# Altium footprint library Reflow3D1411sep.PcbLib: 657 footprints (part 28 of 42)
Each footprint in its own frame and in the unit in brackets; x right, y up, seen from the top. Pads: shape width x height; smd on the part's side, far side on the other; paste and mask are expansions set on the pad; w line width, h text height; cw(c..) or ccw(c..) is an arc to the next point about the centre after c.
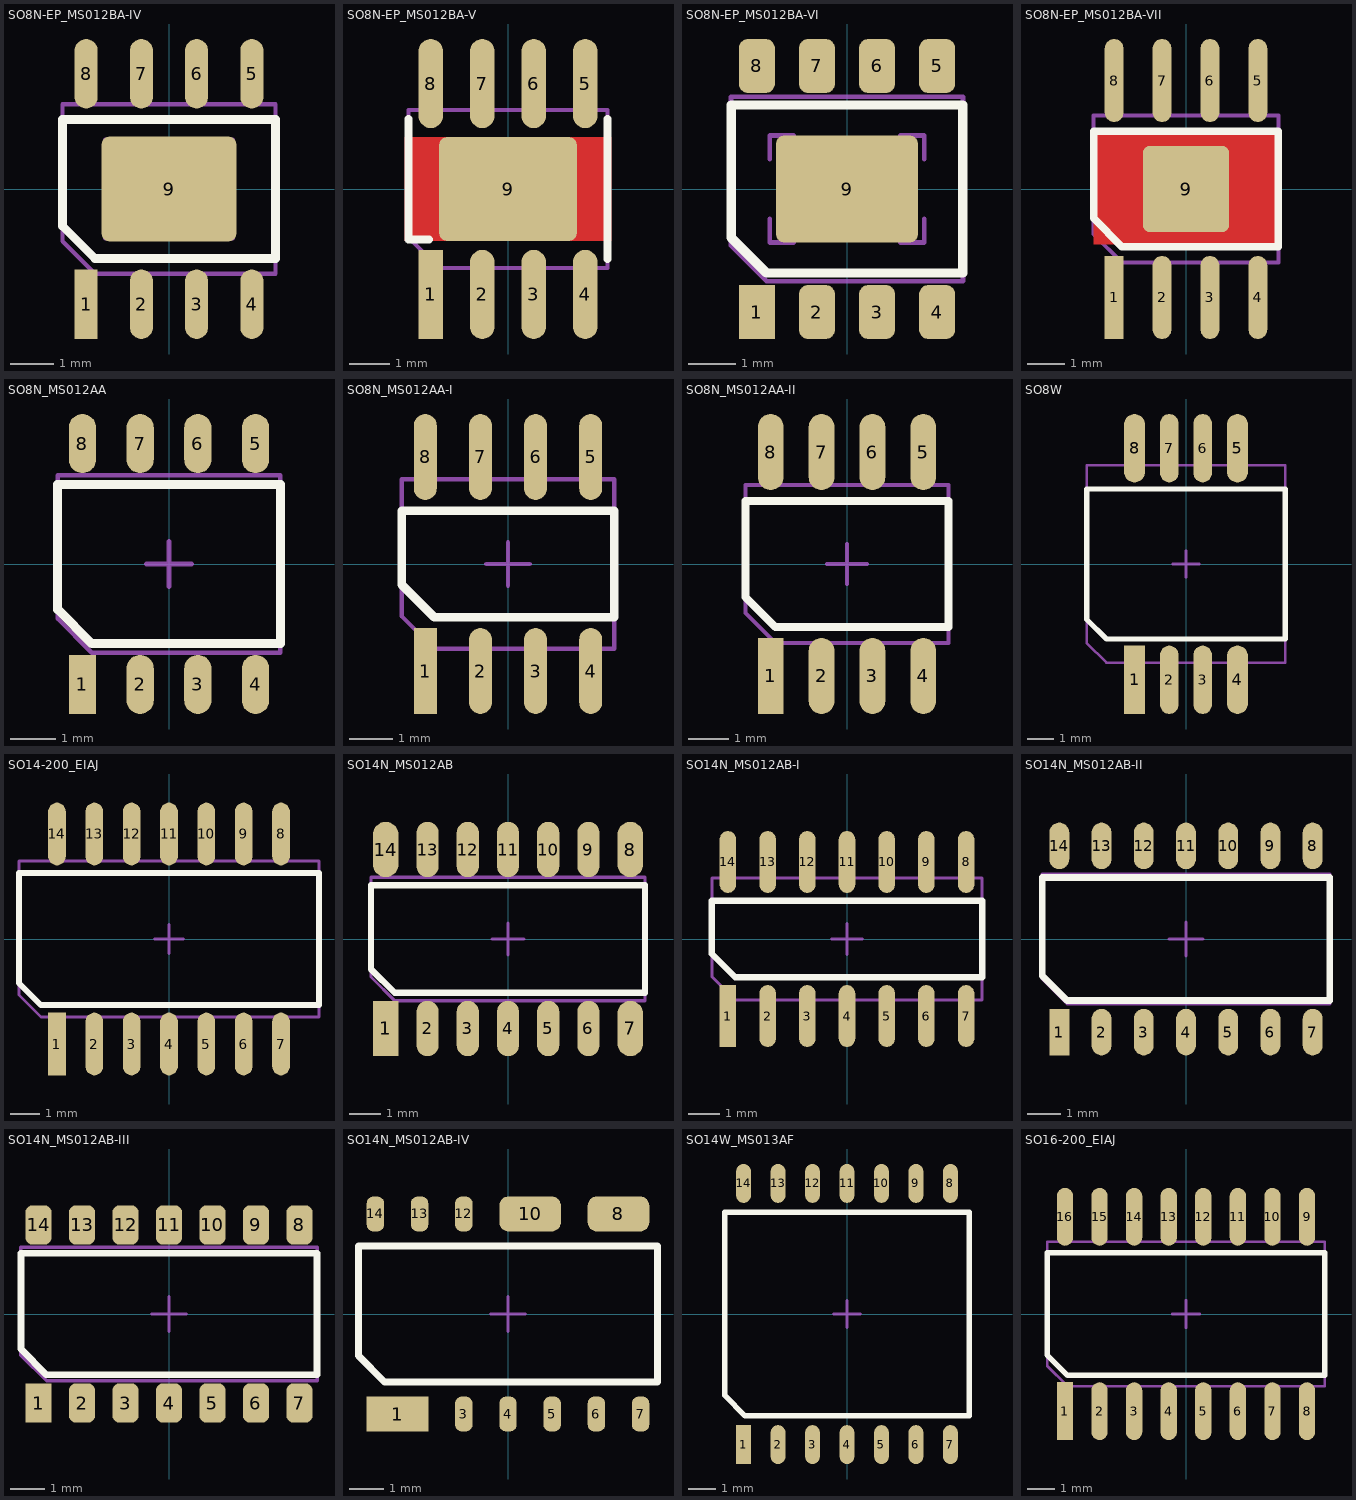
[diagram p27: the footprints below, top view; thin cyan lines are the x and y axes]

## SO8N-EP_MS012BA-IV [mm] "www.maxim-ic.com, 21-0111.PDF, 90-0150.PDF"
height 1.55
pads (9):
  rect 0.53x1.6 smd mask+0.075: 1(-1.905,-2.65)
  oval 0.53x1.6 smd mask+0.075: 2(-0.635,-2.65) 3(0.635,-2.65) 4(1.905,-2.65) 5(1.905,2.65) 6(0.635,2.65) 7(-0.635,2.65) 8(-1.905,2.65)
  rrect15% 3.1x2.41 smd mask+0.075: 9(0,0)
Top Overlay:
  lines w0.2: -2.45,-0.85 -1.7,-1.6 2.45,-1.6 2.45,1.6 -2.45,1.6 -2.45,-0.85
Mechanical 13:
  lines w0.1: -1.47,-0.63 -1.47,-1.13 -0.97,-1.13 ; -1.47,0.63 -1.47,1.13 -0.97,1.13 ; 0.97,-1.13 1.47,-1.13 1.47,-0.63 ; 0.97,1.13 1.47,1.13 1.47,0.63 ; -2.45,-1.2 -2.45,1.95 2.45,1.95 2.45,-1.95 -1.7,-1.95 -2.45,-1.2
Mechanical 15:
  lines w0.1: -0.5,0 0.5,0 ; 0,-0.5 0,0.5
3D body: height 1.68, standoff 0, extent -2.49,-1.995 2.49,1.995

## SO8N-EP_MS012BA-V [mm] "www.semtech.com, sc4520.pdf"
height 1.55
pads (9):
  rect 0.6x2.2 smd mask+0.05: 1(-1.905,-2.6)
  oval 0.6x2.2 smd mask+0.05: 2(-0.635,-2.6) 3(0.635,-2.6) 4(1.905,-2.6) 5(1.905,2.6) 6(0.635,2.6) 7(-0.635,2.6) 8(-1.905,2.6)
  rrect15% 3.4x2.56 smd paste+0 mask-25.4: 9(0,0)
Top Layer:
  region: -2.55,1.28 2.55,1.28 2.55,-1.28 -2.55,-1.28
Top Overlay:
  lines w0.2: -2.45,1.725 -2.45,-1.25 -1.95,-1.25 ; 2.45,-1.725 2.45,1.725
Top Solder:
  region: -1.7,1.33 -1.7,-1.33 1.7,-1.33 1.7,1.33
Mechanical 13:
  lines w0.1: -1.525,-0.705 -1.525,-1.205 -1.025,-1.205 ; -1.525,0.705 -1.525,1.205 -1.025,1.205 ; 1.025,-1.205 1.525,-1.205 1.525,-0.705 ; 1.025,1.205 1.525,1.205 1.525,0.705 ; -2.45,-1.2 -1.7,-1.95 2.45,-1.95 2.45,1.95 -2.45,1.95 -2.45,-1.2
Mechanical 15:
  lines w0.1: -0.5,0 0.5,0 ; 0,-0.5 0,0.5
3D body: height 1.75, standoff 0, extent -2.5,-2 2.5,2

## SO8N-EP_MS012BA-VI [mm] "www.linear.com, SO_8_05-08-1857.pdf"
height 1.55
pads (9):
  rect 0.76x1.14 smd mask+0.075: 1(-1.905,-2.6)
  rrect50% 0.76x1.14 smd mask+0.075: 2(-0.635,-2.6) 3(0.635,-2.6) 4(1.905,-2.6) 5(1.905,2.6) 6(0.635,2.6) 7(-0.635,2.6) 8(-1.905,2.6)
  rrect15% 3x2.26 smd mask+0.075: 9(0,0)
Top Overlay:
  lines w0.2: -2.45,-1.025 -2.45,1.775 2.45,1.775 2.45,-1.775 -1.7,-1.775 -2.45,-1.025
Mechanical 13:
  lines w0.1: -1.63,-0.63 -1.63,-1.13 -1.13,-1.13 ; -1.63,0.63 -1.63,1.13 -1.13,1.13 ; 1.13,-1.13 1.63,-1.13 1.63,-0.63 ; 1.13,1.13 1.63,1.13 1.63,0.63 ; -2.45,-1.2 -2.45,1.95 2.45,1.95 2.45,-1.95 -1.7,-1.95 -2.45,-1.2
Mechanical 15:
  lines w0.1: -0.5,0 0.5,0 ; 0,-0.5 0,0.5
3D body: height 1.75, standoff 0, extent -2.5,-1.995 2.5,1.995

## SO8N-EP_MS012BA-VII [mm] "www.ti.com, ths3095.pdf"
height 1.53
pads (9):
  rect 0.5x2.2 smd mask+0.075: 1(-1.905,-2.875)
  oval 0.5x2.2 smd mask+0.075: 2(-0.635,-2.875) 3(0.635,-2.875) 4(1.905,-2.875) 5(1.905,2.875) 6(0.635,2.875) 7(-0.635,2.875) 8(-1.905,2.875)
  rrect15% 2.28x2.28 smd mask+0: 9(0,0)
Top Layer:
  region: -2.445,1.47 2.445,1.47 2.445,-1.47 -2.445,-1.47
Top Overlay:
  lines w0.2: -2.45,-0.775 -1.7,-1.525 2.45,-1.525 2.45,1.525 -2.45,1.525 -2.45,-0.775
Mechanical 13:
  lines w0.1: -0.89,-0.39 -0.89,-0.89 -0.39,-0.89 ; -0.89,0.39 -0.89,0.89 -0.39,0.89 ; 0.39,-0.89 0.89,-0.89 0.89,-0.39 ; 0.39,0.89 0.89,0.89 0.89,0.39 ; -2.45,-1.2 -2.45,1.95 2.45,1.95 2.45,-1.95 -1.7,-1.95 -2.45,-1.2
Mechanical 15:
  lines w0.1: -0.5,0 0.5,0 ; 0,-0.5 0,0.5
3D body: height 1.7, standoff 0, extent -2.5,-2 2.5,2

## SO8N_MS012AA [mm] "www.nxp.com, sot096-1_po.pdf, SOT96-1_fr.pdf"
height 1.55
pads (8):
  rect 0.6x1.3 smd mask+0.075: 1(-1.905,-2.65)
  oval 0.6x1.3 smd mask+0.075: 2(-0.635,-2.65) 3(0.635,-2.65) 4(1.905,-2.65) 5(1.905,2.65) 6(0.635,2.65) 7(-0.635,2.65) 8(-1.905,2.65)
Top Overlay:
  lines w0.2: -2.45,-1 -2.45,1.75 2.45,1.75 2.45,-1.75 -1.7,-1.75 -2.45,-1
Mechanical 13:
  lines w0.1: -2.45,-1.2 -2.45,1.95 2.45,1.95 2.45,-1.95 -1.7,-1.95 -2.45,-1.2
Mechanical 15:
  lines w0.1: -0.5,0 0.5,0 ; 0,-0.5 0,0.5
3D body: height 1.75, standoff 0, extent -2.5,-2 2.5,2

## SO8N_MS012AA-I [mm] "www.maxim-ic.com, 21-0041.PDF, 90-0096.PDF; www.jedec.org, MS-012F.pdf"
height 1.55
pads (8):
  rect 0.53x1.98 smd mask+0.075: 1(-1.905,-2.465)
  oval 0.53x1.98 smd mask+0.075: 2(-0.635,-2.465) 3(0.635,-2.465) 4(1.905,-2.465) 5(1.905,2.465) 6(0.635,2.465) 7(-0.635,2.465) 8(-1.905,2.465)
Top Overlay:
  lines w0.2: -2.45,-0.475 -1.7,-1.225 2.45,-1.225 2.45,1.225 -2.45,1.225 -2.45,-0.475
Mechanical 13:
  lines w0.1: -2.45,-1.2 -1.7,-1.95 2.45,-1.95 2.45,1.95 -2.45,1.95 -2.45,-1.2
Mechanical 15:
  lines w0.1: -0.5,0 0.5,0 ; 0,-0.5 0,0.5
3D body: height 1.75, standoff 0, extent -2.5,-2 2.5,2

## SO8N_MS012AA-II [mm] "www.avagotech.com, AV01-0547EN.pdf"
height 3.38
pads (8):
  rect 0.64x1.9 smd mask+0.075: 1(-1.905,-2.795)
  oval 0.64x1.9 smd mask+0.075: 2(-0.635,-2.795) 3(0.635,-2.795) 4(1.905,-2.795) 5(1.905,2.795) 6(0.635,2.795) 7(-0.635,2.795) 8(-1.905,2.795)
Top Overlay:
  lines w0.2: -2.54,-0.825 -1.79,-1.575 2.54,-1.575 2.54,1.575 -2.54,1.575 -2.54,-0.825
Mechanical 13:
  lines w0.1: -2.54,-1.22 -1.79,-1.97 2.54,-1.97 2.54,1.97 -2.54,1.97 -2.54,-1.22
Mechanical 15:
  lines w0.1: -0.5,0 0.5,0 ; 0,-0.5 0,0.5
3D body: height 3.61, standoff 0, extent -2.6,-2.03 2.6,2.03

## SO8W [mm] "www.nxp.com, sot176-1.pdf, SOT176-1_fp_reflow.pdf"
height 2.5
pads (8):
  rect 0.8x2.6 smd mask+0.075: 1(-1.955,-4.4)
  oval 0.7x2.6 smd mask+0.075: 2(-0.635,-4.4) 3(0.635,-4.4) 6(0.635,4.4) 7(-0.635,4.4)
  oval 0.8x2.6 smd mask+0.075: 4(1.955,-4.4) 5(1.955,4.4) 8(-1.955,4.4)
Top Overlay:
  lines w0.2: -3.775,-2.1 -3.025,-2.85 3.775,-2.85 3.775,2.85 -3.775,2.85 -3.775,-2.1
Mechanical 13:
  lines w0.1: -3.775,-3 -3.775,3.75 3.775,3.75 3.775,-3.75 -3.025,-3.75 -3.775,-3
Mechanical 15:
  lines w0.1: -0.5,0 0.5,0 ; 0,-0.5 0,0.5
3D body: height 2.65, standoff 0, extent -3.825,-3.8 3.825,3.8

## SO14-200_EIAJ [mm] "www.fairchildsemi.com, M14D.pdf"
height 1.95
pads (14):
  rect 0.6x2.13 smd mask+0.075: 1(-3.81,-3.57)
  oval 0.6x2.13 smd mask+0.075: 2(-2.54,-3.57) 3(-1.27,-3.57) 4(0,-3.57) 5(1.27,-3.57) 6(2.54,-3.57) 7(3.81,-3.57) 8(3.81,3.57) 9(2.54,3.57) 10(1.27,3.57) 11(0,3.57) 12(-1.27,3.57) 13(-2.54,3.57) 14(-3.81,3.57)
Top Overlay:
  lines w0.2: -5.1,-1.5 -4.35,-2.25 5.1,-2.25 5.1,2.25 -5.1,2.25 -5.1,-1.5
Mechanical 13:
  lines w0.1: -5.1,-1.9 -4.35,-2.65 5.1,-2.65 5.1,2.65 -5.1,2.65 -5.1,-1.9
Mechanical 15:
  lines w0.1: -0.5,0 0.5,0 ; 0,-0.5 0,0.5
3D body: height 2.1, standoff 0, extent -5.15,-2.7 5.15,2.7

## SO14N_MS012AB [mm] "www.nxp.com, sot108-1_po.pdf, SOT108-1_fp_reflow.pdf"
height 1.55
pads (14):
  rect 0.8x1.75 smd mask+0.075: 1(-3.86,-2.825)
  oval 0.7x1.75 smd mask+0.075: 2(-2.54,-2.825) 3(-1.27,-2.825) 4(0,-2.825) 5(1.27,-2.825) 6(2.54,-2.825) 9(2.54,2.825) 10(1.27,2.825) 11(0,2.825) 12(-1.27,2.825) 13(-2.54,2.825)
  oval 0.8x1.75 smd mask+0.075: 7(3.86,-2.825) 8(3.86,2.825) 14(-3.86,2.825)
Top Overlay:
  lines w0.2: -4.325,-0.95 -3.575,-1.7 4.325,-1.7 4.325,1.7 -4.325,1.7 -4.325,-0.95
Mechanical 13:
  lines w0.1: -4.325,-1.2 -4.325,1.95 4.325,1.95 4.325,-1.95 -3.575,-1.95 -4.325,-1.2
Mechanical 15:
  lines w0.1: -0.5,0 0.5,0 ; 0,-0.5 0,0.5
3D body: height 1.75, standoff 0, extent -4.375,-2 4.375,2

## SO14N_MS012AB-I [mm] "www.maxim-ic.com, 21-0041.PDF, 90-0112.PDF; www.jedec.org, MS-012F.pdf"
height 1.55
pads (14):
  rect 0.53x1.98 smd mask+0.075: 1(-3.81,-2.465)
  oval 0.53x1.98 smd mask+0.075: 2(-2.54,-2.465) 4(0,-2.465) 5(1.27,-2.465) 6(2.54,-2.465) 7(3.81,-2.465) 8(3.81,2.465) 9(2.54,2.465) 10(1.27,2.465) 11(0,2.465) 13(-2.54,2.465) 14(-3.81,2.465)
  oval 0.53x1.98 smd paste+0 mask+0.075: 3(-1.27,-2.465) 12(-1.27,2.465)
Top Overlay:
  lines w0.2: -4.325,-0.475 -3.575,-1.225 4.325,-1.225 4.325,1.225 -4.325,1.225 -4.325,-0.475
Mechanical 13:
  lines w0.1: -4.325,-1.2 -4.325,1.95 4.325,1.95 4.325,-1.95 -3.575,-1.95 -4.325,-1.2
Mechanical 15:
  lines w0.1: -0.5,0 0.5,0 ; 0,-0.5 0,0.5
3D body: height 1.75, standoff 0, extent -4.375,-2 4.375,2

## SO14N_MS012AB-II [mm] "www.hittite.com, s14_package_info.pdf"
height 1.55
pads (14):
  rect 0.6x1.4 smd mask+0.075: 1(-3.81,-2.8)
  oval 0.6x1.4 smd mask+0.075: 2(-2.54,-2.8) 4(0,-2.8) 5(1.27,-2.8) 6(2.54,-2.8) 7(3.81,-2.8) 8(3.81,2.8) 9(2.54,2.8) 10(1.27,2.8) 11(0,2.8) 13(-2.54,2.8) 14(-3.81,2.8)
  oval 0.6x1.4 smd paste+0 mask+0.075: 3(-1.27,-2.8) 12(-1.27,2.8)
Top Overlay:
  lines w0.2: -4.325,-1.1 -3.575,-1.85 4.325,-1.85 4.325,1.85 -4.325,1.85 -4.325,-1.1
Mechanical 13:
  lines w0.1: -4.325,-1.2 -4.325,1.95 4.325,1.95 4.325,-1.95 -3.575,-1.95 -4.325,-1.2
Mechanical 15:
  lines w0.1: -0.5,0 0.5,0 ; 0,-0.5 0,0.5
3D body: height 1.75, standoff 0, extent -4.375,-2 4.375,2

## SO14N_MS012AB-III [mm] "www.linear.com, SO_14_05-08-1610.pdf"
height 1.55
pads (14):
  rect 0.76x1.14 smd mask+0.075: 1(-3.81,-2.6)
  rrect50% 0.76x1.14 smd mask+0.075: 2(-2.54,-2.6) 4(0,-2.6) 5(1.27,-2.6) 6(2.54,-2.6) 7(3.81,-2.6) 8(3.81,2.6) 9(2.54,2.6) 10(1.27,2.6) 11(0,2.6) 13(-2.54,2.6) 14(-3.81,2.6)
  rrect50% 0.76x1.14 smd paste+0 mask+0.075: 3(-1.27,-2.6) 12(-1.27,2.6)
Top Overlay:
  lines w0.2: -4.325,-1.025 -3.575,-1.775 4.325,-1.775 4.325,1.775 -4.325,1.775 -4.325,-1.025
Mechanical 13:
  lines w0.1: -4.325,-1.2 -4.325,1.95 4.325,1.95 4.325,-1.95 -3.575,-1.95 -4.325,-1.2
Mechanical 15:
  lines w0.1: -0.5,0 0.5,0 ; 0,-0.5 0,0.5
3D body: height 1.75, standoff 0, extent -4.37,-1.995 4.37,1.995

## SO14N_MS012AB-IV [mm] "www.fairchildsemi.com, M14B.pdf"
height 1.6
pads (11):
  rect 1.77x1 smd mask+0.075: 1(-3.175,-2.875)
  rrect75% 0.5x1 smd paste+0 mask+0.075: 3(-1.27,-2.875) 12(-1.27,2.875)
  rrect75% 0.5x1 smd mask+0.075: 4(0,-2.875) 5(1.27,-2.875) 6(2.54,-2.875) 7(3.81,-2.875) 13(-2.54,2.875) 14(-3.81,2.875)
  rrect50% 1.77x1 smd mask+0.075: 8(3.175,2.875) 10(0.635,2.875)
Top Overlay:
  lines w0.2: -4.3,-1.2 -3.55,-1.95 4.3,-1.95 4.3,1.95 -4.3,1.95 -4.3,-1.2
Mechanical 13:
  lines w0.1: -4.3,-1.2 -3.55,-1.95 4.3,-1.95 4.3,1.95 -4.3,1.95 -4.3,-1.2
Mechanical 15:
  lines w0.1: -0.5,0 0.5,0 ; 0,-0.5 0,0.5
3D body: height 1.75, standoff 0, extent -4.35,-2 4.35,2

## SO14W_MS013AF [mm] "www.analog.com, 54614177245586RW_14.pdf, rw-14.pdf; www.jedec.org, MS-013E.pdf"
height 2.5
pads (14):
  rect 0.55x1.43 smd mask+0.075: 1(-3.81,-4.81)
  oval 0.55x1.43 smd mask+0.075: 2(-2.54,-4.81) 3(-1.27,-4.81) 4(0,-4.81) 5(1.27,-4.81) 6(2.54,-4.81) 7(3.81,-4.81) 8(3.81,4.81) 9(2.54,4.81) 10(1.27,4.81) 11(0,4.81) 12(-1.27,4.81) 13(-2.54,4.81) 14(-3.81,4.81)
Top Overlay:
  lines w0.2: -4.5,-3 -4.5,3.75 4.5,3.75 4.5,-3.75 -3.75,-3.75 -4.5,-3
Mechanical 13:
  lines w0.1: -4.5,-3 -4.5,3.75 4.5,3.75 4.5,-3.75 -3.75,-3.75 -4.5,-3
Mechanical 15:
  lines w0.1: -0.5,0 0.5,0 ; 0,-0.5 0,0.5
3D body: height 2.65, standoff 0, extent -4.6,-3.8 4.6,3.8

## SO16-200_EIAJ [mm] "www.fairchildsemi.com, M16D.pdf"
height 1.95
pads (16):
  rect 0.6x2.13 smd mask+0.075: 1(-4.445,-3.57)
  oval 0.6x2.13 smd mask+0.075: 2(-3.175,-3.57) 3(-1.905,-3.57) 4(-0.635,-3.57) 5(0.635,-3.57) 6(1.905,-3.57) 7(3.175,-3.57) 8(4.445,-3.57) 9(4.445,3.57) 10(3.175,3.57) 11(1.905,3.57) 12(0.635,3.57) 13(-0.635,3.57) 14(-1.905,3.57) 15(-3.175,3.57) 16(-4.445,3.57)
Top Overlay:
  lines w0.2: -5.1,-1.5 -4.35,-2.25 5.1,-2.25 5.1,2.25 -5.1,2.25 -5.1,-1.5
Mechanical 13:
  lines w0.1: -5.1,-1.9 -4.35,-2.65 5.1,-2.65 5.1,2.65 -5.1,2.65 -5.1,-1.9
Mechanical 15:
  lines w0.1: -0.5,0 0.5,0 ; 0,-0.5 0,0.5
3D body: height 2.1, standoff 0, extent -5.15,-2.7 5.15,2.7